# Altium footprint library 19-Resistors.PcbLib: 199 footprints (part 8 of 13)
Each footprint in its own frame and in the unit in brackets; x right, y up, seen from the top. Pads: shape width x height; smd on the part's side, far side on the other; paste and mask are expansions set on the pad; w line width, h text height; cw(c..) or ccw(c..) is an arc to the next point about the centre after c.
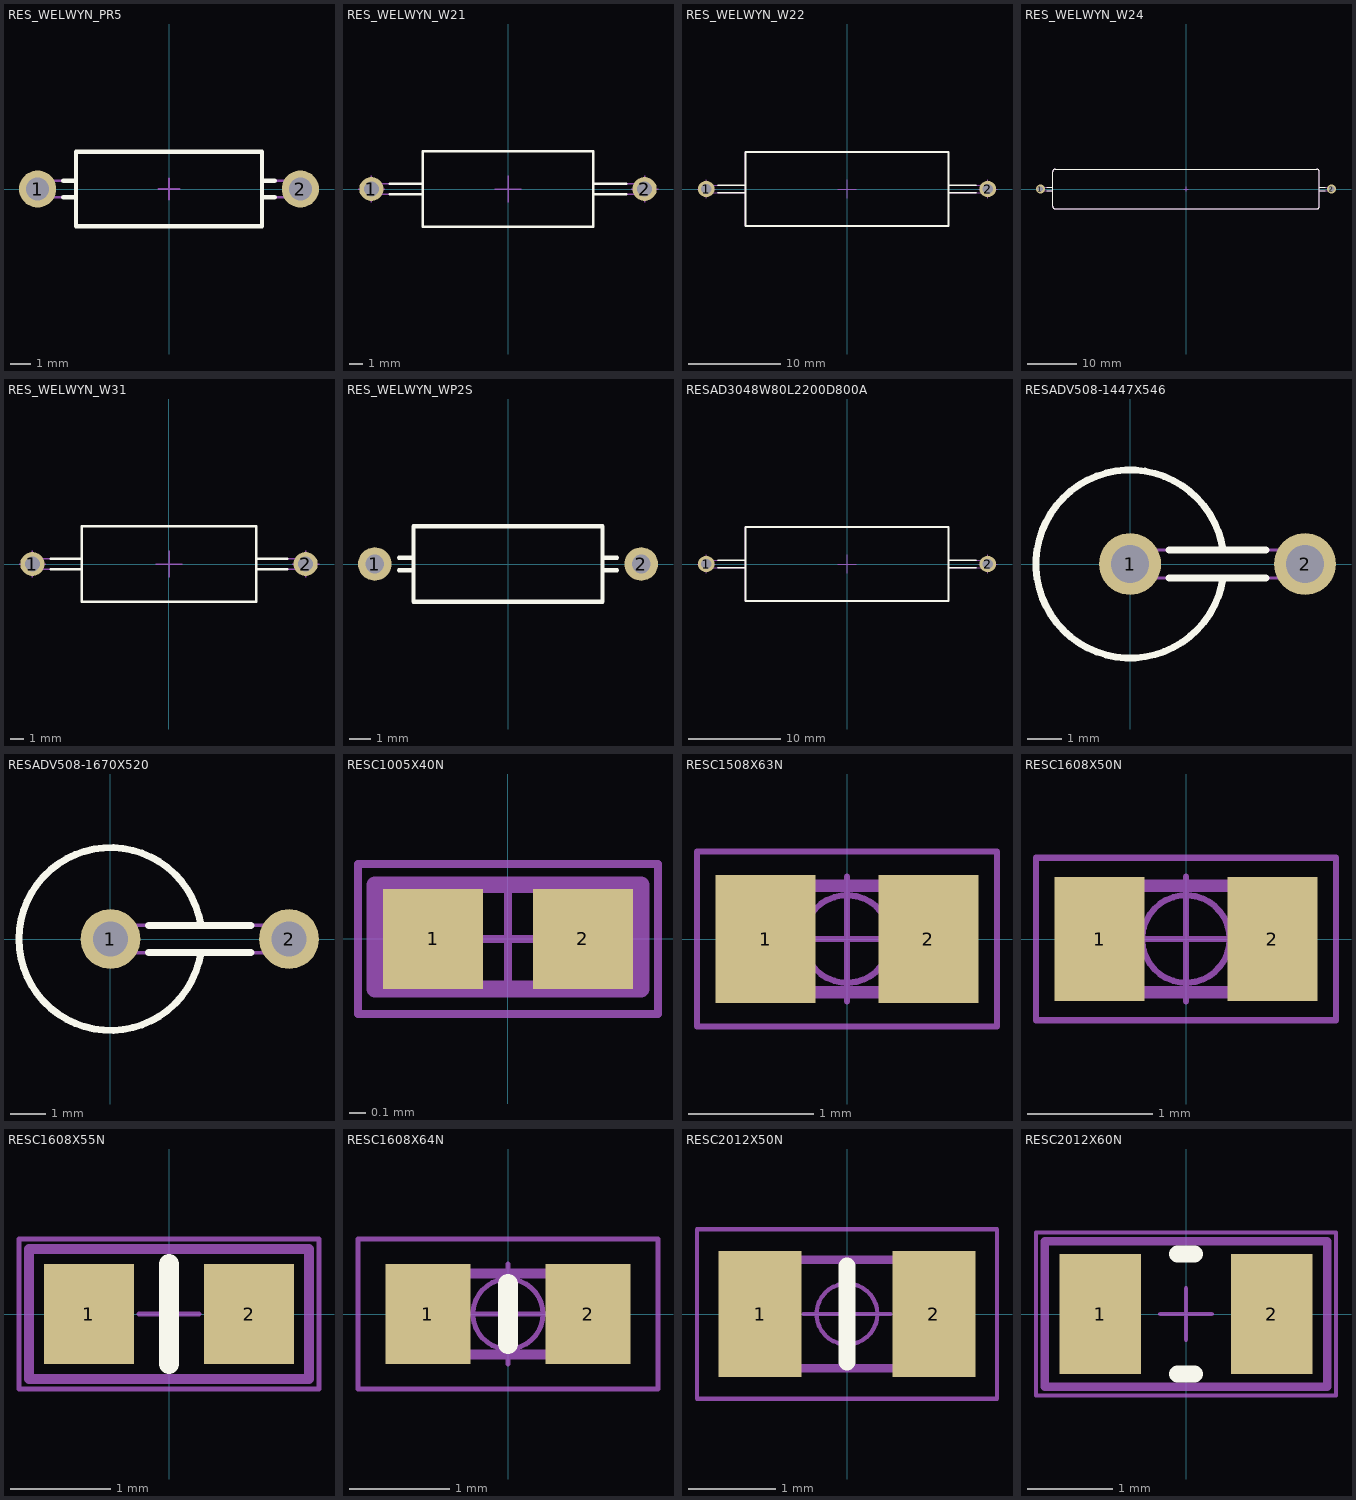
[diagram p7: the footprints below, top view; thin cyan lines are the x and y axes]

## RES_WELWYN_PR5 [mm] "Resistor, Axial, Pad spacing 12.7mm - Body Lengh 9mm X Body Diameter 3.6mm"
height 3.6
pads (2):
  round 1.8 hole 1.1: 1(-6.35,0) 2(6.35,0)
Top Overlay:
  lines w0.2: -5.113,-0.4 -4.5,-0.4 ; -5.113,0.4 -4.5,0.4 ; 4.5,-0.4 5.113,-0.4 ; 4.5,0.4 5.113,0.4 ; -4.5,-1.8 4.5,-1.8 4.5,1.8 -4.5,1.8 -4.5,-1.8
Mechanical 8:
  lines w0.1: -6.85,0 -6.35,0 ; -6.35,-0.5 -6.35,0 ; -6.35,0.5 -6.35,0 ; -5.85,0 -6.35,0 ; -0.5,0 0,0 ; 0,-0.5 0,0 ; 0,0.5 0,0 ; 0.5,0 0,0 ; 5.85,0 6.35,0 ; 6.35,-0.5 6.35,0 ; 6.35,0.5 6.35,0 ; 6.85,0 6.35,0
Mechanical 14:
  lines w0.1: -4.5,-0.4 -6.35,-0.4 cw(c-6.35,0) -6.35,0.4 -4.5,0.4 ; 4.5,-0.4 6.35,-0.4 ccw(c6.35,0) 6.35,0.4 4.5,0.4 ; -4.5,-1.8 4.5,-1.8 4.5,1.8 -4.5,1.8 -4.5,-1.8
3D body "v200-130.stp": height 0.02, standoff -1.65, extent 5.35,-1 7.35,1
3D body "v200-130.stp": height 0.02, standoff -1.65, extent -7.35,-1 -5.35,1
3D body "RES_WELWYN_PR5.stp": height 3.6, standoff -3.6, extent -6.75,-1.8 6.75,1.8

## RES_WELWYN_W21 [mm] "Resistor, Axial, Leads spacing 20.32mm, Lead Dia. 0.8, Body Lengh 12.7mm, Diameter 5.6mm"
height 5.6
pads (2):
  round 1.8 hole 1.1: 1(-10.16,0) 2(10.16,0)
Top Overlay:
  lines w0.2: -8.8,-0.4 -6.35,-0.4 ; -8.8,0.4 -6.35,0.4 ; 6.35,-0.4 8.8,-0.4 ; 6.35,0.4 8.8,0.4 ; -6.35,-2.8 6.35,-2.8 6.35,2.8 -6.35,2.8 -6.35,-2.8
Mechanical 8:
  lines w0.1: -11.16,0 -10.16,0 ; -10.16,-1 -10.16,0 ; -10.16,1 -10.16,0 ; -9.16,0 -10.16,0 ; -1,0 0,0 ; 0,-1 0,0 ; 0,1 0,0 ; 1,0 0,0 ; 9.16,0 10.16,0 ; 10.16,-1 10.16,0 ; 10.16,1 10.16,0 ; 11.16,0 10.16,0
Mechanical 14:
  lines w0.1: -6.35,-0.4 -10.16,-0.4 cw(c-10.16,0) -10.16,0.4 -6.35,0.4 ; 6.35,-0.4 10.16,-0.4 ccw(c10.16,0) 10.16,0.4 6.35,0.4 ; -6.35,-2.8 6.35,-2.8 6.35,2.8 -6.35,2.8 -6.35,-2.8
3D body "v200-130.stp": height 0.02, standoff -1.65, extent 9.16,-1 11.16,1
3D body "v200-130.stp": height 0.02, standoff -1.65, extent -11.16,-1 -9.16,1
3D body "RES_WELWYN_W21.stp": height 5.6, standoff -3.8, extent -10.59,-2.8 10.59,2.8

## RES_WELWYN_W22 [mm] "Resistor, Axial, Leads spacing 30.48mm, Lead Dia. 0.8, Body Lengh 22mm, Diameter 8mm"
height 8
pads (2):
  round 1.8 hole 1.1: 1(-15.24,0) 2(15.24,0)
Top Overlay:
  lines w0.2: -14,-0.4 -11,-0.4 ; -14,0.4 -11,0.4 ; 11,-0.4 14,-0.4 ; 11,0.4 14,0.4 ; -11,-4 -11,4 11,4 11,-4 -11,-4
Mechanical 8:
  lines w0.1: -16.24,0 -15.24,0 ; -15.24,-1 -15.24,0 ; -15.24,1 -15.24,0 ; -14.24,0 -15.24,0 ; -1,0 0,0 ; 0,-1 0,0 ; 0,1 0,0 ; 1,0 0,0 ; 14.24,0 15.24,0 ; 15.24,-1 15.24,0 ; 15.24,1 15.24,0 ; 16.24,0 15.24,0
Mechanical 14:
  lines w0.1: -11,-0.4 -15.24,-0.4 cw(c-15.24,0) -15.24,0.4 -11,0.4 ; 11,-0.4 15.24,-0.4 ccw(c15.24,0) 15.24,0.4 11,0.4 ; -11,-4 11,-4 11,4 -11,4 -11,-4
3D body "v200-130.stp": height 0.02, standoff -1.65, extent 14.24,-1 16.24,1
3D body "v200-130.stp": height 0.02, standoff -1.65, extent -16.24,-1 -14.24,1
3D body "RESAD3048W80L2200D800A.stp": height 8, standoff -3.8, extent -15.64,-4 15.64,4

## RES_WELWYN_W24 [mm] "Resistor, Axial, Pad spacing 58.42mm - Body Lengh 53.5mm X Body Diameter 8mm"
height 8
pads (2):
  round 1.8 hole 1.1: 1(-29.21,0) 2(29.21,0)
Top Overlay:
  lines w0.2: -27.973,-0.4 -26.75,-0.4 ; -27.973,0.4 -26.75,0.4 ; 26.75,-0.4 27.973,-0.4 ; 26.75,0.4 27.973,0.4 ; -26.75,-3.5 ccw(c-26.25,-3.5) -26.25,-4 26.25,-4 ccw(c26.25,-3.5) 26.75,-3.5 26.75,3.5 ccw(c26.25,3.5) 26.25,4 -26.25,4 ccw(c-26.25,3.5) -26.75,3.5 -26.75,-3.5
Mechanical 8:
  lines w0.1: -29.21,0 -29.21,0.5 -29.21,0 ; -29.21,0 -28.71,0 -29.21,0 ; -29.21,0 -29.21,-0.5 -29.21,0 ; -29.21,0 -29.71,0 -29.21,0 ; 0,0 0,0.5 0,0 ; 0,0 0.5,0 0,0 ; 0,0 0,-0.5 0,0 ; 0,0 -0.5,0 0,0 ; 29.21,0 29.21,0.5 29.21,0 ; 29.21,0 29.71,0 29.21,0 ; 29.21,0 29.21,-0.5 29.21,0 ; 29.21,0 28.71,0 29.21,0
Mechanical 14:
  lines w0.1: -26.75,-0.4 -29.21,-0.4 cw(c-29.21,0) -29.21,0.4 -26.75,0.4 ; 26.75,-0.4 29.21,-0.4 ccw(c29.21,0) 29.21,0.4 26.75,0.4 ; -26.75,-3.5 ccw(c-26.25,-3.5) -26.25,-4 26.25,-4 ccw(c26.25,-3.5) 26.75,-3.5 26.75,3.5 ccw(c26.25,3.5) 26.25,4 -26.25,4 ccw(c-26.25,3.5) -26.75,3.5 -26.75,-3.5
3D body "v200-130.stp": height 0.02, standoff -1.65, extent 28.21,-1 30.21,1
3D body "v200-130.stp": height 0.02, standoff -1.65, extent -30.21,-1 -28.21,1
3D body "RES_WELWYN_W24.stp": height 8, standoff -3.6, extent -29.61,-4 29.61,4

## RES_WELWYN_W31 [mm] "Resistor, Axial, Leads spacing 20.32mm, Lead Dia. 0.8, Body Lengh 13mm, Diameter 5.6mm"
height 5.6
pads (2):
  round 1.8 hole 1.1: 1(-10.16,0) 2(10.16,0)
Top Overlay:
  lines w0.2: -8.8,-0.4 -6.5,-0.4 ; -8.8,0.4 -6.5,0.4 ; 6.5,-0.4 8.8,-0.4 ; 6.5,0.4 8.8,0.4 ; -6.5,-2.8 -6.5,2.8 6.5,2.8 6.5,-2.8 -6.5,-2.8
Mechanical 8:
  lines w0.1: -11.16,0 -10.16,0 ; -10.16,-1 -10.16,0 ; -10.16,1 -10.16,0 ; -9.16,0 -10.16,0 ; -1,0 0,0 ; 0,-1 0,0 ; 0,1 0,0 ; 1,0 0,0 ; 9.16,0 10.16,0 ; 10.16,-1 10.16,0 ; 10.16,1 10.16,0 ; 11.16,0 10.16,0
Mechanical 14:
  lines w0.1: -6.5,-0.4 -10.16,-0.4 cw(c-10.16,0) -10.16,0.4 -6.5,0.4 ; 6.5,-0.4 10.16,-0.4 ccw(c10.16,0) 10.16,0.4 6.5,0.4 ; -6.5,-2.8 -6.5,2.8 6.5,2.8 6.5,-2.8 -6.5,-2.8
3D body "v200-130.stp": height 0.02, standoff -1.65, extent 9.16,-1 11.16,1
3D body "v200-130.stp": height 0.02, standoff -1.65, extent -11.16,-1 -9.16,1
3D body "RES_WELWYN_W31.stp": height 5.6, standoff -3.8, extent -10.59,-2.8 10.59,2.8

## RES_WELWYN_WP2S [mm] "Resistor, Axial, Pad spacing 12.7 mm - Body Lengh 9mm X Body Diameter 3.6mm"
height 3.6
pads (2):
  round 1.6 hole 0.9: 1(-6.35,0) 2(6.35,0)
Top Overlay:
  lines w0.2: -5.2,-0.3 -4.5,-0.3 ; -5.2,0.3 -4.5,0.3 ; 4.5,-0.3 5.2,-0.3 ; 4.5,0.3 5.2,0.3 ; -4.5,-1.8 -4.5,1.8 4.5,1.8 4.5,-1.8 -4.5,-1.8
Mechanical 14:
  lines w0.1: -5.2,-0.3 -4.5,-0.3 ; -5.2,0.3 -4.5,0.3 ; 4.5,-0.3 5.2,-0.3 ; 4.5,0.3 5.2,0.3 ; -4.5,-1.8 4.5,-1.8 4.5,1.8 -4.5,1.8 -4.5,-1.8
3D body "v200-130.stp": height 0.02, standoff -1.65, extent 5.35,-1 7.35,1
3D body "v200-130.stp": height 0.02, standoff -1.65, extent -7.35,-1 -5.35,1
3D body "RES_WELWYN_WP2S.stp": height 3.6, standoff -3.6, extent -6.65,-1.8 6.65,1.8

## RESAD3048W80L2200D800A [mm] "Resistor, Axial, Leads spacing 30.48mm, Lead Dia. 0.8, Body Lengh 22mm, Diameter 8mm"
height 8
pads (2):
  round 1.8 hole 1.1: 1(-15.24,0) 2(15.24,0)
Top Overlay:
  lines w0.2: -14,-0.4 -11,-0.4 ; -14,0.4 -11,0.4 ; 11,-0.4 14,-0.4 ; 11,0.4 14,0.4 ; -11,-4 -11,4 11,4 11,-4 -11,-4
Mechanical 8:
  lines w0.1: -16.24,0 -15.24,0 ; -15.24,-1 -15.24,0 ; -15.24,1 -15.24,0 ; -14.24,0 -15.24,0 ; -1,0 0,0 ; 0,-1 0,0 ; 0,1 0,0 ; 1,0 0,0 ; 14.24,0 15.24,0 ; 15.24,-1 15.24,0 ; 15.24,1 15.24,0 ; 16.24,0 15.24,0
Mechanical 14:
  lines w0.1: -11,-0.4 -15.24,-0.4 cw(c-15.24,0) -15.24,0.4 -11,0.4 ; 11,-0.4 15.24,-0.4 ccw(c15.24,0) 15.24,0.4 11,0.4 ; -11,-4 11,-4 11,4 -11,4 -11,-4
3D body "v200-130.stp": height 0.02, standoff -1.65, extent 14.24,-1 16.24,1
3D body "v200-130.stp": height 0.02, standoff -1.65, extent -16.24,-1 -14.24,1
3D body "RESAD3048W80L2200D800A.stp": height 8, standoff -3.8, extent -15.64,-4 15.64,4

## RESADV508-1447X546 [mm] "Resistor, Axial, Vertical Mount, Pad spacing 5.08mm - Body Lengh 14.22mm X Body Diameter 17.2mm"
height 17.2
pads (2):
  round 1.8 hole 1.1: 1(0,0) 2(5.08,0)
Top Overlay:
  lines w0.2: 1.129,-0.406 3.951,-0.406 ; 1.129,0.406 3.951,0.406 ; 2.7,-0.406 cw(c0,0) 2.7,0.407
Mechanical 8:
  lines w0.1: -0.5,0 0,0 ; 0,-0.5 0,0 ; 0,0.5 0,0 ; 0.5,0 0,0 ; 4.58,0 5.08,0 ; 5.08,-0.5 5.08,0 ; 5.08,0.5 5.08,0 ; 5.58,0 5.08,0
Mechanical 14:
  lines w0.1: 2.7,-0.406 cw(c0,0) 2.7,0.407 ; 0,0.406 ccw(c0,0) 0.017,-0.406 5.08,-0.406 ccw(c5.08,0) 5.08,0.406 0,0.406
3D body "v200-130.stp": height 0.02, standoff -1.65, extent 4.08,-1 6.08,1
3D body "v200-130.stp": height 0.02, standoff -1.65, extent -1,-1 1,1
3D body "RESADV508-1447X546.stp": height 17.17, standoff -3.8, extent -2.73,-2.73 5.487,2.73

## RESADV508-1670X520 [mm] "Resistor, Axial, Vertical Mount, Lead spacing 5.08 mm - Body Lengh 16.7mm X Body Diameter 5.2mm"
height 23.6
pads (2):
  round 1.7 hole 1: 1(0,0) 2(5.08,0)
Top Overlay:
  lines w0.2: 1.082,-0.39 3.998,-0.39 ; 1.082,0.39 3.998,0.39 ; 2.571,-0.39 cw(c0,0) 2.571,0.39
Mechanical 8:
  lines w0.1: -0.5,0 0,0 ; 0,-0.5 0,0 ; 0,0.5 0,0 ; 0.5,0 0,0 ; 4.58,0 5.08,0 ; 5.08,-0.5 5.08,0 ; 5.08,0.5 5.08,0 ; 5.58,0 5.08,0
Mechanical 14:
  lines w0.1: 2.571,-0.39 cw(c0,0) 2.571,0.39 ; 0,-0.39 cw(c0,0) 0,0.39 5.08,0.39 cw(c5.08,0) 5.08,-0.39 0,-0.39
3D body "v200-130.stp": height 0.02, standoff -1.65, extent 4.08,-1 6.08,1
3D body "v200-130.stp": height 0.02, standoff -1.65, extent -1,-1 1,1
3D body "RESADV508-1670X520.stp": height 23.6, standoff -3.7, extent -2.6,-2.6 5.47,2.6

## RESC1005X40N [mm] "Chip Resistor, EIA 0402, Metric 1005, Body 1.0x0.5mm, IPC Medium Density"
height 0.4
pads (2):
  rect 0.6x0.6 smd: 1(-0.45,0) 2(0.45,0)
Mechanical 14:
  lines w0.1: -0.8,-0.3 0.8,-0.3 0.8,0.325 -0.8,0.325 -0.8,-0.3
Mechanical 15:
  lines w0.05: -0.3,0 0.3,0 ; 0,-0.3 0,0.3 ; -0.9,-0.45 0.9,-0.45 0.9,0.45 -0.9,0.45 -0.9,-0.45
3D body "p060-060.stp": height 0.02, standoff 0, extent -0.75,-0.3 -0.15,0.3
3D body "p060-060.stp": height 0.02, standoff 0, extent 0.15,-0.3 0.75,0.3
3D body "RESC1005X40N.stp": height 0.4, standoff 0, extent -0.525,-0.275 0.525,0.275

## RESC1508X63N [mm] "Chip Resistor, EIA 0603, Metric 1608, Body 1.5x0.8mm, IPC Medium Density"
height 0.63
pads (2):
  rect 0.8x1.02 smd: 1(-0.65,0) 2(0.65,0)
Mechanical 14:
  lines w0.1: -0.76,-0.425 -0.76,0.425 0.76,0.425 0.76,-0.425 -0.76,-0.425
Mechanical 15:
  circle w0.05: c0,0 r0.35
  lines w0.05: -0.5,0 0.5,0 ; 0,-0.5 0,0.5 ; -1.2,-0.7 -1.2,0.7 1.2,0.7 1.2,-0.7 -1.2,-0.7
3D body "p102-080.stp": height 0.02, standoff 0, extent 0.25,-0.51 1.05,0.51
3D body "p102-080.stp": height 0.02, standoff 0, extent -1.05,-0.51 -0.25,0.51
3D body "RESC1508X63N.stp": height 0.63, standoff 0, extent -0.76,-0.425 0.76,0.425

## RESC1608X50N [mm] "Chip Resistor, EIA 0603, Metric 1608, Body 1.6x0.8mm, IPC Medium Density"
height 0.5
pads (2):
  rect 0.72x0.99 smd: 1(-0.69,0) 2(0.69,0)
Mechanical 14:
  lines w0.1: -0.788,-0.425 -0.788,0.425 0.788,0.425 0.788,-0.425 -0.788,-0.425
Mechanical 15:
  circle w0.05: c0,0 r0.35
  lines w0.05: -0.5,0 0.5,0 ; 0,-0.5 0,0.5 ; -1.2,-0.65 -1.2,0.65 1.2,0.65 1.2,-0.65 -1.2,-0.65
3D body "p099-072.stp": height 0.02, standoff 0, extent 0.33,-0.495 1.05,0.495
3D body "p099-072.stp": height 0.02, standoff 0, extent -1.05,-0.495 -0.33,0.495
3D body "RESC1608X50N.stp": height 0.5, standoff 0, extent -0.875,-0.475 0.875,0.475

## RESC1608X55N [mm] "Chip Resistor, EIA 0603, Metric 1608, Body 1.6x0.8mm, IPC Medium Density"
height 0.55
pads (2):
  rect 0.9x1 smd: 1(-0.8,0) 2(0.8,0)
Top Overlay:
  lines w0.2: 0,-0.5 0,0.5
Mechanical 14:
  lines w0.1: -1.4,-0.65 -1.4,0.65 1.4,0.65 1.4,-0.65 -1.4,-0.65
Mechanical 15:
  lines w0.05: -0.3,0 0.3,0 ; 0,-0.3 0,0.3 ; -1.5,-0.75 1.5,-0.75 1.5,0.75 -1.5,0.75 -1.5,-0.75
3D body "p100-090.stp": height 0.02, standoff 0, extent -1.25,-0.5 -0.35,0.5
3D body "p100-090.stp": height 0.02, standoff 0, extent 0.35,-0.5 1.25,0.5
3D body "RESC1608X55N.stp": height 0.55, standoff 0, extent -0.875,-0.475 0.875,0.475

## RESC1608X64N [mm] "Chip Resistor, EIA 0603, Metric 1608, Body 1.6x0.8mm, IPC Medium Density"
height 0.64
pads (2):
  rect 0.85x1 smd: 1(-0.8,0) 2(0.8,0)
Top Overlay:
  lines w0.2: 0,-0.3 0,0.3
Mechanical 14:
  lines w0.1: -0.8,-0.405 -0.8,0.405 0.8,0.405 0.8,-0.405 -0.8,-0.405
Mechanical 15:
  circle w0.05: c0,0 r0.35
  lines w0.05: -0.5,0 0.5,0 ; 0,-0.5 0,0.5 ; -1.5,-0.75 -1.5,0.75 1.5,0.75 1.5,-0.75 -1.5,-0.75
3D body "p100-085.stp": height 0.02, standoff 0, extent -1.225,-0.5 -0.375,0.5
3D body "p100-085.stp": height 0.02, standoff 0, extent 0.375,-0.5 1.225,0.5
3D body "RESC1608X64N.stp": height 0.64, standoff 0, extent -0.875,-0.475 0.875,0.475

## RESC2012X50N [mm] "Chip Resistor, EIA 0805, Metric 2012, Body 2.0x1.25mm, IPC Medium Density"
height 0.5
pads (2):
  rect 0.95x1.45 smd: 1(-1,0) 2(1,0)
Top Overlay:
  lines w0.2: 0,-0.55 0,0.55
Mechanical 14:
  lines w0.1: -1.025,-0.625 1.025,-0.625 1.025,0.625 -1.025,0.625 -1.025,-0.625
Mechanical 15:
  circle w0.05: c0,0 r0.35
  lines w0.05: -0.5,0 0.5,0 ; 0,-0.5 0,0.5 ; -1.725,-0.975 1.725,-0.975 1.725,0.975 -1.725,0.975 -1.725,-0.975
3D body "RESC2012X50N.stp": height 0.5, standoff 0, extent -1.1,-0.675 1.1,0.675
3D body "p145-095.stp": height 0.02, standoff 0, extent -1.475,-0.725 -0.525,0.725
3D body "p145-095.stp": height 0.02, standoff 0, extent 0.525,-0.725 1.475,0.725

## RESC2012X60N [mm] "Chip Resistor, EIA 0805, Metric 2012, Body 2.0x1.2mm, IPC Medium Density"
height 0.6
pads (2):
  rect 0.95x1.4 smd: 1(-1,0) 2(1,0)
Top Overlay:
  lines w0.2: -0.1,-0.7 0.1,-0.7 ; -0.1,0.7 0.1,0.7
Mechanical 14:
  lines w0.1: -1.65,-0.85 -1.65,0.85 1.65,0.85 1.65,-0.85 -1.65,-0.85
Mechanical 15:
  lines w0.05: -0.3,0 0.3,0 ; 0,-0.3 0,0.3 ; -1.75,-0.95 1.75,-0.95 1.75,0.95 -1.75,0.95 -1.75,-0.95
3D body "RESC2012X60N.stp": height 0.6, standoff 0, extent -1.1,-0.675 1.1,0.675
3D body "p140-090.stp": height 0.02, standoff 0, extent 0.55,-0.7 1.45,0.7
3D body "p140-090.stp": height 0.02, standoff 0, extent -1.45,-0.7 -0.55,0.7